# Altium schematic symbol library jlcpcb_2025_04_capacitors_extended_1206.schlib: 2503 symbols (part 4 of 14) (continued)
## 12065D475KAT2A
designator C?  Capacitance: 4.7uF  (hidden comment: *)
Capacitor, Ceramic (MLCC), 4.7uF, ±10%, 50V, X5R, ±10%, SMD 1206; Manufacturer: Kyocera AVX; Manufacturer Part Number: 12065D475KAT2A; Package Size: 1206; JLCPCB Basic Part: No; JLCPCB Part Number: C2175800; Supplier 1: LCSC; Category: Capacitors - MLCC; Supplier Part Number 1: C2175800; Tolerance: ±10%; Voltage Rating: 50V; Temperature Coefficient: X5R; RoHS: Yes; ComponentLink1Description: Datasheet; ComponentLink1URL: https://wmsc.lcsc.com/wmsc/upload/file/pdf/v2/lcsc/2304140030_Kyocera-AVX-12065D475KAT2A_C2175800.pdf; ComponentLink2Description: JLCPCB Part URL; ComponentLink2URL: https://jlcpcb.com/partdetail/C2175800; ComponentLink3Description: LCSC Part URL; ComponentLink3URL: https://lcsc.com/product-detail/Multilayer-Ceramic-Capacitors-MLCC---SMD-SMT_Kyocera-AVX-Kyocera-AVX-12065D475KAT2A_C2175800.html
footprint CAP-1206 (1206 (3216M) Capacitor)
pins: 1, 2

## 12065F104K4T2A
designator C?  Capacitance: 100nF  (hidden comment: *)
Capacitor, Ceramic (MLCC), 100nF, ±10%, 50V, X8R, ±10%, SMD 1206; Manufacturer: Kyocera AVX; Manufacturer Part Number: 12065F104K4T2A; Package Size: 1206; JLCPCB Basic Part: No; JLCPCB Part Number: C2171580; Supplier 1: LCSC; Category: Capacitors - MLCC; Supplier Part Number 1: C2171580; Tolerance: ±10%; Voltage Rating: 50V; Temperature Coefficient: X8R; RoHS: Yes; ComponentLink1Description: Datasheet; ComponentLink1URL: https://wmsc.lcsc.com/wmsc/upload/file/pdf/v2/lcsc/2304140030_Kyocera-AVX-12065F104K4T2A_C2171580.pdf; ComponentLink2Description: JLCPCB Part URL; ComponentLink2URL: https://jlcpcb.com/partdetail/C2171580; ComponentLink3Description: LCSC Part URL; ComponentLink3URL: https://lcsc.com/product-detail/Multilayer-Ceramic-Capacitors-MLCC---SMD-SMT_Kyocera-AVX-Kyocera-AVX-12065F104K4T2A_C2171580.html
footprint CAP-1206 (1206 (3216M) Capacitor)
pins: 1, 2

## 12066C226KAT2A
designator C?  Capacitance: 22uF  (hidden comment: *)
Capacitor, Ceramic (MLCC), 22uF, ±10%, 6.3V, X7R, ±10%, SMD 1206; Manufacturer: AVX; Manufacturer Part Number: 12066C226KAT2A; Package Size: 1206; JLCPCB Basic Part: No; JLCPCB Part Number: C597529; Supplier 1: LCSC; Category: Capacitors - MLCC; Supplier Part Number 1: C597529; Tolerance: ±10%; Voltage Rating: 6.3V; Temperature Coefficient: X7R; RoHS: Yes; ComponentLink1Description: Datasheet; ComponentLink1URL: https://wmsc.lcsc.com/wmsc/upload/file/pdf/v2/lcsc/2304140030_Kyocera-AVX-12066C226KAT2A_C597529.pdf; ComponentLink2Description: JLCPCB Part URL; ComponentLink2URL: https://jlcpcb.com/partdetail/C597529; ComponentLink3Description: LCSC Part URL; ComponentLink3URL: https://lcsc.com/product-detail/Multilayer-Ceramic-Capacitors-MLCC---SMD-SMT_Kyocera-AVX-Kyocera-AVX-12066C226KAT2A_C597529.html
footprint CAP-1206 (1206 (3216M) Capacitor)
pins: 1, 2

## 12066D107MAT2A
designator C?  Capacitance: 100uF  (hidden comment: *)
Capacitor, Ceramic (MLCC), 100uF, ±20%, 6.3V, X5R, ±20%, SMD 1206; Manufacturer: Kyocera AVX; Manufacturer Part Number: 12066D107MAT2A; Package Size: 1206; JLCPCB Basic Part: No; JLCPCB Part Number: C2181396; Supplier 1: LCSC; Category: Capacitors - MLCC; Supplier Part Number 1: C2181396; Tolerance: ±20%; Voltage Rating: 6.3V; Temperature Coefficient: X5R; RoHS: Yes; ComponentLink1Description: Datasheet; ComponentLink1URL: https://wmsc.lcsc.com/wmsc/upload/file/pdf/v2/lcsc/2304140030_Kyocera-AVX-12066D107MAT2A_C2181396.pdf; ComponentLink2Description: JLCPCB Part URL; ComponentLink2URL: https://jlcpcb.com/partdetail/C2181396; ComponentLink3Description: LCSC Part URL; ComponentLink3URL: https://lcsc.com/product-detail/Multilayer-Ceramic-Capacitors-MLCC---SMD-SMT_Kyocera-AVX-Kyocera-AVX-12066D107MAT2A_C2181396.html
footprint CAP-1206 (1206 (3216M) Capacitor)
pins: 1, 2

## 12067A101JAT2A
designator C?  Capacitance: 100pF  (hidden comment: *)
Capacitor, Ceramic (MLCC), 100pF, ±5%, 500V, C0G, ±5%, SMD 1206; Manufacturer: AVX; Manufacturer Part Number: 12067A101JAT2A; Package Size: 1206; JLCPCB Basic Part: No; JLCPCB Part Number: C597533; Supplier 1: LCSC; Category: Capacitors - MLCC; Supplier Part Number 1: C597533; Tolerance: ±5%; Voltage Rating: 500V; Temperature Coefficient: C0G; RoHS: Yes; ComponentLink1Description: Datasheet; ComponentLink1URL: https://wmsc.lcsc.com/wmsc/upload/file/pdf/v2/lcsc/2304140030_Kyocera-AVX-12067A101JAT2A_C597533.pdf; ComponentLink2Description: JLCPCB Part URL; ComponentLink2URL: https://jlcpcb.com/partdetail/C597533; ComponentLink3Description: LCSC Part URL; ComponentLink3URL: https://lcsc.com/product-detail/Multilayer-Ceramic-Capacitors-MLCC---SMD-SMT_Kyocera-AVX-Kyocera-AVX-12067A101JAT2A_C597533.html
footprint CAP-1206 (1206 (3216M) Capacitor)
pins: 1, 2

## AC1206JKNPOZBN102
designator C?  Capacitance: 1nF  (hidden comment: *)
Capacitor, Ceramic (MLCC), 1nF, ±5%, 630V, NP0, ±5%, SMD 1206; Manufacturer: YAGEO; Manufacturer Part Number: AC1206JKNPOZBN102; Package Size: 1206; JLCPCB Basic Part: No; JLCPCB Part Number: C149600; Supplier 1: LCSC; Category: Capacitors - MLCC; Supplier Part Number 1: C149600; Tolerance: ±5%; Voltage Rating: 630V; Temperature Coefficient: NP0; RoHS: Yes; ComponentLink1Description: Datasheet; ComponentLink1URL: https://wmsc.lcsc.com/wmsc/upload/file/pdf/v2/lcsc/2304140030_YAGEO-AC1206JKNPOZBN102_C149600.pdf; ComponentLink2Description: JLCPCB Part URL; ComponentLink2URL: https://jlcpcb.com/partdetail/C149600; ComponentLink3Description: LCSC Part URL; ComponentLink3URL: https://lcsc.com/product-detail/Multilayer-Ceramic-Capacitors-MLCC---SMD-SMT_YAGEO-YAGEO-AC1206JKNPOZBN102_C149600.html
footprint CAP-1206 (1206 (3216M) Capacitor)
pins: 1, 2

## AC1206JRNPO0BN221
designator C?  Capacitance: 220pF  (hidden comment: *)
Capacitor, Ceramic (MLCC), 220pF, ±5%, 100V, NP0, ±5%, SMD 1206; Manufacturer: YAGEO; Manufacturer Part Number: AC1206JRNPO0BN221; Package Size: 1206; JLCPCB Basic Part: No; JLCPCB Part Number: C2173256; Supplier 1: LCSC; Category: Capacitors - MLCC; Supplier Part Number 1: C2173256; Tolerance: ±5%; Voltage Rating: 100V; Temperature Coefficient: NP0; RoHS: Yes; ComponentLink1Description: Datasheet; ComponentLink1URL: https://wmsc.lcsc.com/wmsc/upload/file/pdf/v2/lcsc/2202040630_YAGEO-AC1206JRNPO0BN221_C2173256.pdf; ComponentLink2Description: JLCPCB Part URL; ComponentLink2URL: https://jlcpcb.com/partdetail/C2173256; ComponentLink3Description: LCSC Part URL; ComponentLink3URL: https://lcsc.com/product-detail/Multilayer-Ceramic-Capacitors-MLCC---SMD-SMT_YAGEO-YAGEO-AC1206JRNPO0BN221_C2173256.html
footprint CAP-1206 (1206 (3216M) Capacitor)
pins: 1, 2

## AC1206JRNPO0BN222
designator C?  Capacitance: 2.2nF  (hidden comment: *)
Capacitor, Ceramic (MLCC), 2.2nF, ±5%, 100V, NP0, ±5%, SMD 1206; Manufacturer: YAGEO; Manufacturer Part Number: AC1206JRNPO0BN222; Package Size: 1206; JLCPCB Basic Part: No; JLCPCB Part Number: C2172509; Supplier 1: LCSC; Category: Capacitors - MLCC; Supplier Part Number 1: C2172509; Tolerance: ±5%; Voltage Rating: 100V; Temperature Coefficient: NP0; RoHS: Yes; ComponentLink1Description: Datasheet; ComponentLink1URL: https://wmsc.lcsc.com/wmsc/upload/file/pdf/v2/lcsc/2202040600_YAGEO-AC1206JRNPO0BN222_C2172509.pdf; ComponentLink2Description: JLCPCB Part URL; ComponentLink2URL: https://jlcpcb.com/partdetail/C2172509; ComponentLink3Description: LCSC Part URL; ComponentLink3URL: https://lcsc.com/product-detail/Multilayer-Ceramic-Capacitors-MLCC---SMD-SMT_YAGEO-YAGEO-AC1206JRNPO0BN222_C2172509.html
footprint CAP-1206 (1206 (3216M) Capacitor)
pins: 1, 2

## AC1206JRNPO9BN100
designator C?  Capacitance: 10pF  (hidden comment: *)
Capacitor, Ceramic (MLCC), 10pF, ±5%, 50V, NP0, ±5%, SMD 1206; Manufacturer: YAGEO; Manufacturer Part Number: AC1206JRNPO9BN100; Package Size: 1206; JLCPCB Basic Part: No; JLCPCB Part Number: C2173386; Supplier 1: LCSC; Category: Capacitors - MLCC; Supplier Part Number 1: C2173386; Tolerance: ±5%; Voltage Rating: 50V; Temperature Coefficient: NP0; RoHS: Yes; ComponentLink1Description: Datasheet; ComponentLink1URL: https://wmsc.lcsc.com/wmsc/upload/file/pdf/v2/lcsc/2202040630_YAGEO-AC1206JRNPO9BN100_C2173386.pdf; ComponentLink2Description: JLCPCB Part URL; ComponentLink2URL: https://jlcpcb.com/partdetail/C2173386; ComponentLink3Description: LCSC Part URL; ComponentLink3URL: https://lcsc.com/product-detail/Multilayer-Ceramic-Capacitors-MLCC---SMD-SMT_YAGEO-YAGEO-AC1206JRNPO9BN100_C2173386.html
footprint CAP-1206 (1206 (3216M) Capacitor)
pins: 1, 2

## AC1206JRNPO9BN101
designator C?  Capacitance: 100pF  (hidden comment: *)
Capacitor, Ceramic (MLCC), 100pF, ±5%, 50V, NP0, ±5%, SMD 1206; Manufacturer: YAGEO; Manufacturer Part Number: AC1206JRNPO9BN101; Package Size: 1206; JLCPCB Basic Part: No; JLCPCB Part Number: C2172561; Supplier 1: LCSC; Category: Capacitors - MLCC; Supplier Part Number 1: C2172561; Tolerance: ±5%; Voltage Rating: 50V; Temperature Coefficient: NP0; RoHS: Yes; ComponentLink1Description: Datasheet; ComponentLink1URL: https://wmsc.lcsc.com/wmsc/upload/file/pdf/v2/lcsc/2202040600_YAGEO-AC1206JRNPO9BN101_C2172561.pdf; ComponentLink2Description: JLCPCB Part URL; ComponentLink2URL: https://jlcpcb.com/partdetail/C2172561; ComponentLink3Description: LCSC Part URL; ComponentLink3URL: https://lcsc.com/product-detail/Multilayer-Ceramic-Capacitors-MLCC---SMD-SMT_YAGEO-YAGEO-AC1206JRNPO9BN101_C2172561.html
footprint CAP-1206 (1206 (3216M) Capacitor)
pins: 1, 2

## AC1206JRNPO9BN182
designator C?  Capacitance: 1.8nF  (hidden comment: *)
Capacitor, Ceramic (MLCC), 1.8nF, ±5%, 50V, NP0, ±5%, SMD 1206; Manufacturer: YAGEO; Manufacturer Part Number: AC1206JRNPO9BN182; Package Size: 1206; JLCPCB Basic Part: No; JLCPCB Part Number: C2242686; Supplier 1: LCSC; Category: Capacitors - MLCC; Supplier Part Number 1: C2242686; Tolerance: ±5%; Voltage Rating: 50V; Temperature Coefficient: NP0; RoHS: Yes; ComponentLink1Description: Datasheet; ComponentLink1URL: https://wmsc.lcsc.com/wmsc/upload/file/pdf/v2/lcsc/2304140030_YAGEO-AC1206JRNPO9BN182_C2242686.pdf; ComponentLink2Description: JLCPCB Part URL; ComponentLink2URL: https://jlcpcb.com/partdetail/C2242686; ComponentLink3Description: LCSC Part URL; ComponentLink3URL: https://lcsc.com/product-detail/Multilayer-Ceramic-Capacitors-MLCC---SMD-SMT_YAGEO-YAGEO-AC1206JRNPO9BN182_C2242686.html
footprint CAP-1206 (1206 (3216M) Capacitor)
pins: 1, 2

## AC1206JRNPO9BN222
designator C?  Capacitance: 2.2nF  (hidden comment: *)
Capacitor, Ceramic (MLCC), 2.2nF, ±5%, 50V, NP0, ±5%, SMD 1206; Manufacturer: YAGEO; Manufacturer Part Number: AC1206JRNPO9BN222; Package Size: 1206; JLCPCB Basic Part: No; JLCPCB Part Number: C2175580; Supplier 1: LCSC; Category: Capacitors - MLCC; Supplier Part Number 1: C2175580; Tolerance: ±5%; Voltage Rating: 50V; Temperature Coefficient: NP0; RoHS: Yes; ComponentLink1Description: Datasheet; ComponentLink1URL: https://wmsc.lcsc.com/wmsc/upload/file/pdf/v2/lcsc/2202040800_YAGEO-AC1206JRNPO9BN222_C2175580.pdf; ComponentLink2Description: JLCPCB Part URL; ComponentLink2URL: https://jlcpcb.com/partdetail/C2175580; ComponentLink3Description: LCSC Part URL; ComponentLink3URL: https://lcsc.com/product-detail/Multilayer-Ceramic-Capacitors-MLCC---SMD-SMT_YAGEO-YAGEO-AC1206JRNPO9BN222_C2175580.html
footprint CAP-1206 (1206 (3216M) Capacitor)
pins: 1, 2

## AC1206JRNPO9BN331
designator C?  Capacitance: 330pF  (hidden comment: *)
Capacitor, Ceramic (MLCC), 330pF, ±5%, 50V, NP0, ±5%, SMD 1206; Manufacturer: YAGEO; Manufacturer Part Number: AC1206JRNPO9BN331; Package Size: 1206; JLCPCB Basic Part: No; JLCPCB Part Number: C2228484; Supplier 1: LCSC; Category: Capacitors - MLCC; Supplier Part Number 1: C2228484; Tolerance: ±5%; Voltage Rating: 50V; Temperature Coefficient: NP0; RoHS: Yes; ComponentLink1Description: Datasheet; ComponentLink1URL: https://wmsc.lcsc.com/wmsc/upload/file/pdf/v2/lcsc/2304140030_YAGEO-AC1206JRNPO9BN331_C2228484.pdf; ComponentLink2Description: JLCPCB Part URL; ComponentLink2URL: https://jlcpcb.com/partdetail/C2228484; ComponentLink3Description: LCSC Part URL; ComponentLink3URL: https://lcsc.com/product-detail/Multilayer-Ceramic-Capacitors-MLCC---SMD-SMT_YAGEO-YAGEO-AC1206JRNPO9BN331_C2228484.html
footprint CAP-1206 (1206 (3216M) Capacitor)
pins: 1, 2

## AC1206JRNPO9BN471
designator C?  Capacitance: 470pF  (hidden comment: *)
Capacitor, Ceramic (MLCC), 470pF, ±5%, 50V, NP0, ±5%, SMD 1206; Manufacturer: YAGEO; Manufacturer Part Number: AC1206JRNPO9BN471; Package Size: 1206; JLCPCB Basic Part: No; JLCPCB Part Number: C2173766; Supplier 1: LCSC; Category: Capacitors - MLCC; Supplier Part Number 1: C2173766; Tolerance: ±5%; Voltage Rating: 50V; Temperature Coefficient: NP0; RoHS: Yes; ComponentLink1Description: Datasheet; ComponentLink1URL: https://wmsc.lcsc.com/wmsc/upload/file/pdf/v2/lcsc/2202040630_YAGEO-AC1206JRNPO9BN471_C2173766.pdf; ComponentLink2Description: JLCPCB Part URL; ComponentLink2URL: https://jlcpcb.com/partdetail/C2173766; ComponentLink3Description: LCSC Part URL; ComponentLink3URL: https://lcsc.com/product-detail/Multilayer-Ceramic-Capacitors-MLCC---SMD-SMT_YAGEO-YAGEO-AC1206JRNPO9BN471_C2173766.html
footprint CAP-1206 (1206 (3216M) Capacitor)
pins: 1, 2

## AC1206JRNPOBBN220
designator C?  Capacitance: 22pF  (hidden comment: *)
Capacitor, Ceramic (MLCC), 22pF, ±5%, 500V, NP0, ±5%, SMD 1206; Manufacturer: YAGEO; Manufacturer Part Number: AC1206JRNPOBBN220; Package Size: 1206; JLCPCB Basic Part: No; JLCPCB Part Number: C2179619; Supplier 1: LCSC; Category: Capacitors - MLCC; Supplier Part Number 1: C2179619; Tolerance: ±5%; Voltage Rating: 500V; Temperature Coefficient: NP0; RoHS: Yes; ComponentLink1Description: Datasheet; ComponentLink1URL: https://wmsc.lcsc.com/wmsc/upload/file/pdf/v2/lcsc/2202041100_YAGEO-AC1206JRNPOBBN220_C2179619.pdf; ComponentLink2Description: JLCPCB Part URL; ComponentLink2URL: https://jlcpcb.com/partdetail/C2179619; ComponentLink3Description: LCSC Part URL; ComponentLink3URL: https://lcsc.com/product-detail/Multilayer-Ceramic-Capacitors-MLCC---SMD-SMT_YAGEO-YAGEO-AC1206JRNPOBBN220_C2179619.html
footprint CAP-1206 (1206 (3216M) Capacitor)
pins: 1, 2

## AC1206JRNPOBBN681
designator C?  Capacitance: 680pF  (hidden comment: *)
Capacitor, Ceramic (MLCC), 680pF, ±5%, 500V, C0G, ±5%, SMD 1206; Manufacturer: YAGEO; Manufacturer Part Number: AC1206JRNPOBBN681; Package Size: 1206; JLCPCB Basic Part: No; JLCPCB Part Number: C3871624; Supplier 1: LCSC; Category: Capacitors - MLCC; Supplier Part Number 1: C3871624; Tolerance: ±5%; Voltage Rating: 500V; Temperature Coefficient: C0G; RoHS: Yes; ComponentLink1Description: Datasheet; ComponentLink1URL: https://wmsc.lcsc.com/wmsc/upload/file/pdf/v2/lcsc/2311211113_YAGEO-AC1206JRNPOBBN681_C3871624.pdf; ComponentLink2Description: JLCPCB Part URL; ComponentLink2URL: https://jlcpcb.com/partdetail/C3871624; ComponentLink3Description: LCSC Part URL; ComponentLink3URL: https://lcsc.com/product-detail/Multilayer-Ceramic-Capacitors-MLCC---SMD-SMT_YAGEO-YAGEO-AC1206JRNPOBBN681_C3871624.html
footprint CAP-1206 (1206 (3216M) Capacitor)
pins: 1, 2

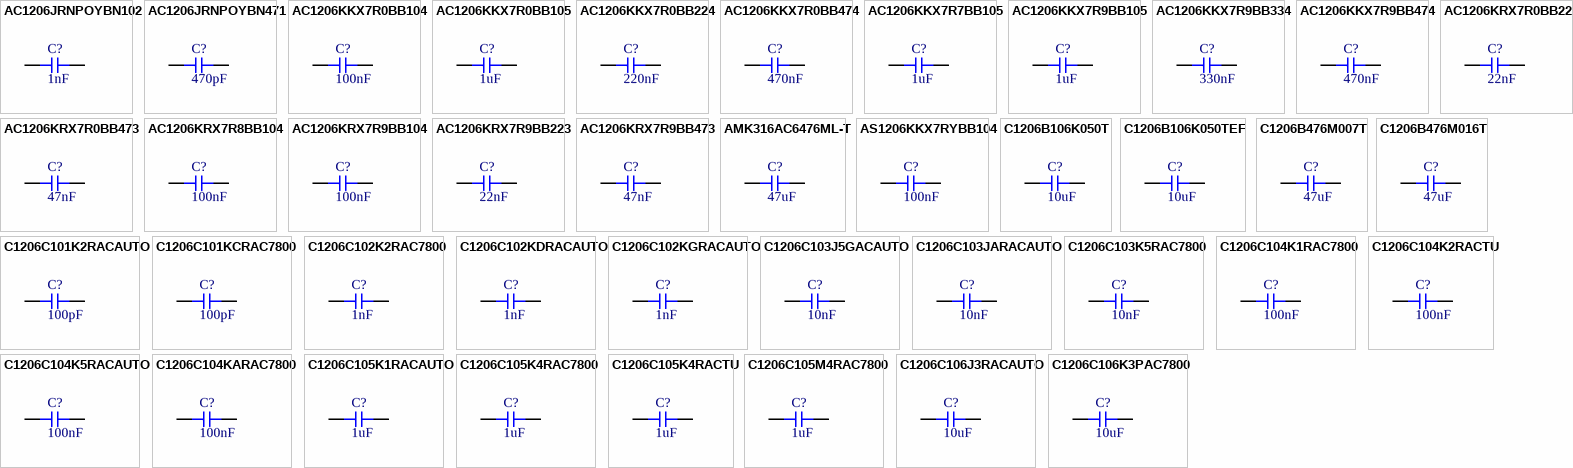
[diagram p15: symbols AC1206JRNPOYBN102 to C1206C106K3PAC7800]

## AC1206JRNPOYBN102
designator C?  Capacitance: 1nF  (hidden comment: *)
Capacitor, Ceramic (MLCC), 1nF, ±5%, 250V, C0G, ±5%, SMD 1206; Manufacturer: YAGEO; Manufacturer Part Number: AC1206JRNPOYBN102; Package Size: 1206; JLCPCB Basic Part: No; JLCPCB Part Number: C3871879; Supplier 1: LCSC; Category: Capacitors - MLCC; Supplier Part Number 1: C3871879; Tolerance: ±5%; Voltage Rating: 250V; Temperature Coefficient: C0G; RoHS: Yes; ComponentLink1Description: Datasheet; ComponentLink1URL: https://wmsc.lcsc.com/wmsc/upload/file/pdf/v2/lcsc/2311211113_YAGEO-AC1206JRNPOYBN102_C3871879.pdf; ComponentLink2Description: JLCPCB Part URL; ComponentLink2URL: https://jlcpcb.com/partdetail/C3871879; ComponentLink3Description: LCSC Part URL; ComponentLink3URL: https://lcsc.com/product-detail/Multilayer-Ceramic-Capacitors-MLCC---SMD-SMT_YAGEO-YAGEO-AC1206JRNPOYBN102_C3871879.html
footprint CAP-1206 (1206 (3216M) Capacitor)
pins: 1, 2

## AC1206JRNPOYBN471
designator C?  Capacitance: 470pF  (hidden comment: *)
Capacitor, Ceramic (MLCC), 470pF, ±5%, 250V, NP0, ±5%, SMD 1206; Manufacturer: YAGEO; Manufacturer Part Number: AC1206JRNPOYBN471; Package Size: 1206; JLCPCB Basic Part: No; JLCPCB Part Number: C2172346; Supplier 1: LCSC; Category: Capacitors - MLCC; Supplier Part Number 1: C2172346; Tolerance: ±5%; Voltage Rating: 250V; Temperature Coefficient: NP0; RoHS: Yes; ComponentLink1Description: Datasheet; ComponentLink1URL: https://wmsc.lcsc.com/wmsc/upload/file/pdf/v2/lcsc/2202040600_YAGEO-AC1206JRNPOYBN471_C2172346.pdf; ComponentLink2Description: JLCPCB Part URL; ComponentLink2URL: https://jlcpcb.com/partdetail/C2172346; ComponentLink3Description: LCSC Part URL; ComponentLink3URL: https://lcsc.com/product-detail/Multilayer-Ceramic-Capacitors-MLCC---SMD-SMT_YAGEO-YAGEO-AC1206JRNPOYBN471_C2172346.html
footprint CAP-1206 (1206 (3216M) Capacitor)
pins: 1, 2

## AC1206KKX7R0BB104
designator C?  Capacitance: 100nF  (hidden comment: *)
Capacitor, Ceramic (MLCC), 100nF, ±10%, 100V, X7R, ±10%, SMD 1206; Manufacturer: YAGEO; Manufacturer Part Number: AC1206KKX7R0BB104; Package Size: 1206; JLCPCB Basic Part: No; JLCPCB Part Number: C149601; Supplier 1: LCSC; Category: Capacitors - MLCC; Supplier Part Number 1: C149601; Tolerance: ±10%; Voltage Rating: 100V; Temperature Coefficient: X7R; RoHS: Yes; ComponentLink1Description: Datasheet; ComponentLink1URL: https://wmsc.lcsc.com/wmsc/upload/file/pdf/v2/lcsc/2304140030_YAGEO-AC1206KKX7R0BB104_C149601.pdf; ComponentLink2Description: JLCPCB Part URL; ComponentLink2URL: https://jlcpcb.com/partdetail/C149601; ComponentLink3Description: LCSC Part URL; ComponentLink3URL: https://lcsc.com/product-detail/Multilayer-Ceramic-Capacitors-MLCC---SMD-SMT_YAGEO-YAGEO-AC1206KKX7R0BB104_C149601.html
footprint CAP-1206 (1206 (3216M) Capacitor)
pins: 1, 2

## AC1206KKX7R0BB105
designator C?  Capacitance: 1uF  (hidden comment: *)
Capacitor, Ceramic (MLCC), 1uF, ±10%, 100V, X7R, ±10%, SMD 1206; Manufacturer: YAGEO; Manufacturer Part Number: AC1206KKX7R0BB105; Package Size: 1206; JLCPCB Basic Part: No; JLCPCB Part Number: C2936627; Supplier 1: LCSC; Category: Capacitors - MLCC; Supplier Part Number 1: C2936627; Tolerance: ±10%; Voltage Rating: 100V; Temperature Coefficient: X7R; RoHS: Yes; ComponentLink1Description: Datasheet; ComponentLink1URL: https://wmsc.lcsc.com/wmsc/upload/file/pdf/v2/lcsc/2201121730_YAGEO-AC1206KKX7R0BB105_C2936627.pdf; ComponentLink2Description: JLCPCB Part URL; ComponentLink2URL: https://jlcpcb.com/partdetail/C2936627; ComponentLink3Description: LCSC Part URL; ComponentLink3URL: https://lcsc.com/product-detail/Multilayer-Ceramic-Capacitors-MLCC---SMD-SMT_YAGEO-YAGEO-AC1206KKX7R0BB105_C2936627.html
footprint CAP-1206 (1206 (3216M) Capacitor)
pins: 1, 2

## AC1206KKX7R0BB224
designator C?  Capacitance: 220nF  (hidden comment: *)
Capacitor, Ceramic (MLCC), 220nF, ±10%, 100V, X7R, ±10%, SMD 1206; Manufacturer: YAGEO; Manufacturer Part Number: AC1206KKX7R0BB224; Package Size: 1206; JLCPCB Basic Part: No; JLCPCB Part Number: C389112; Supplier 1: LCSC; Category: Capacitors - MLCC; Supplier Part Number 1: C389112; Tolerance: ±10%; Voltage Rating: 100V; Temperature Coefficient: X7R; RoHS: Yes; ComponentLink1Description: Datasheet; ComponentLink1URL: https://wmsc.lcsc.com/wmsc/upload/file/pdf/v2/lcsc/1912111437_YAGEO-AC1206KKX7R0BB224_C389112.pdf; ComponentLink2Description: JLCPCB Part URL; ComponentLink2URL: https://jlcpcb.com/partdetail/C389112; ComponentLink3Description: LCSC Part URL; ComponentLink3URL: https://lcsc.com/product-detail/Multilayer-Ceramic-Capacitors-MLCC---SMD-SMT_YAGEO-YAGEO-AC1206KKX7R0BB224_C389112.html
footprint CAP-1206 (1206 (3216M) Capacitor)
pins: 1, 2

## AC1206KKX7R0BB474
designator C?  Capacitance: 470nF  (hidden comment: *)
Capacitor, Ceramic (MLCC), 470nF, ±10%, 100V, X7R, ±10%, SMD 1206; Manufacturer: YAGEO; Manufacturer Part Number: AC1206KKX7R0BB474; Package Size: 1206; JLCPCB Basic Part: No; JLCPCB Part Number: C726603; Supplier 1: LCSC; Category: Capacitors - MLCC; Supplier Part Number 1: C726603; Tolerance: ±10%; Voltage Rating: 100V; Temperature Coefficient: X7R; RoHS: Yes; ComponentLink1Description: Datasheet; ComponentLink1URL: https://wmsc.lcsc.com/wmsc/upload/file/pdf/v2/lcsc/2304140030_YAGEO-AC1206KKX7R0BB474_C726603.pdf; ComponentLink2Description: JLCPCB Part URL; ComponentLink2URL: https://jlcpcb.com/partdetail/C726603; ComponentLink3Description: LCSC Part URL; ComponentLink3URL: https://lcsc.com/product-detail/Multilayer-Ceramic-Capacitors-MLCC---SMD-SMT_YAGEO-YAGEO-AC1206KKX7R0BB474_C726603.html
footprint CAP-1206 (1206 (3216M) Capacitor)
pins: 1, 2

## AC1206KKX7R7BB105
designator C?  Capacitance: 1uF  (hidden comment: *)
Capacitor, Ceramic (MLCC), 1uF, ±10%, 16V, X7R, ±10%, SMD 1206; Manufacturer: YAGEO; Manufacturer Part Number: AC1206KKX7R7BB105; Package Size: 1206; JLCPCB Basic Part: No; JLCPCB Part Number: C2172210; Supplier 1: LCSC; Category: Capacitors - MLCC; Supplier Part Number 1: C2172210; Tolerance: ±10%; Voltage Rating: 16V; Temperature Coefficient: X7R; RoHS: Yes; ComponentLink1Description: Datasheet; ComponentLink1URL: https://wmsc.lcsc.com/wmsc/upload/file/pdf/v2/lcsc/2202040530_YAGEO-AC1206KKX7R7BB105_C2172210.pdf; ComponentLink2Description: JLCPCB Part URL; ComponentLink2URL: https://jlcpcb.com/partdetail/C2172210; ComponentLink3Description: LCSC Part URL; ComponentLink3URL: https://lcsc.com/product-detail/Multilayer-Ceramic-Capacitors-MLCC---SMD-SMT_YAGEO-YAGEO-AC1206KKX7R7BB105_C2172210.html
footprint CAP-1206 (1206 (3216M) Capacitor)
pins: 1, 2

## AC1206KKX7R9BB105
designator C?  Capacitance: 1uF  (hidden comment: *)
Capacitor, Ceramic (MLCC), 1uF, ±10%, 50V, X7R, ±10%, SMD 1206; Manufacturer: YAGEO; Manufacturer Part Number: AC1206KKX7R9BB105; Package Size: 1206; JLCPCB Basic Part: No; JLCPCB Part Number: C1853626; Supplier 1: LCSC; Category: Capacitors - MLCC; Supplier Part Number 1: C1853626; Tolerance: ±10%; Voltage Rating: 50V; Temperature Coefficient: X7R; RoHS: Yes; ComponentLink1Description: Datasheet; ComponentLink1URL: https://wmsc.lcsc.com/wmsc/upload/file/pdf/v2/lcsc/2202151130_YAGEO-AC1206KKX7R9BB105_C1853626.pdf; ComponentLink2Description: JLCPCB Part URL; ComponentLink2URL: https://jlcpcb.com/partdetail/C1853626; ComponentLink3Description: LCSC Part URL; ComponentLink3URL: https://lcsc.com/product-detail/Multilayer-Ceramic-Capacitors-MLCC---SMD-SMT_YAGEO-YAGEO-AC1206KKX7R9BB105_C1853626.html
footprint CAP-1206 (1206 (3216M) Capacitor)
pins: 1, 2

## AC1206KKX7R9BB334
designator C?  Capacitance: 330nF  (hidden comment: *)
Capacitor, Ceramic (MLCC), 330nF, ±10%, 50V, X7R, ±10%, SMD 1206; Manufacturer: YAGEO; Manufacturer Part Number: AC1206KKX7R9BB334; Package Size: 1206; JLCPCB Basic Part: No; JLCPCB Part Number: C2257815; Supplier 1: LCSC; Category: Capacitors - MLCC; Supplier Part Number 1: C2257815; Tolerance: ±10%; Voltage Rating: 50V; Temperature Coefficient: X7R; RoHS: Yes; ComponentLink1Description: Datasheet; ComponentLink1URL: https://wmsc.lcsc.com/wmsc/upload/file/pdf/v2/lcsc/2304140030_YAGEO-AC1206KKX7R9BB334_C2257815.pdf; ComponentLink2Description: JLCPCB Part URL; ComponentLink2URL: https://jlcpcb.com/partdetail/C2257815; ComponentLink3Description: LCSC Part URL; ComponentLink3URL: https://lcsc.com/product-detail/Multilayer-Ceramic-Capacitors-MLCC---SMD-SMT_YAGEO-YAGEO-AC1206KKX7R9BB334_C2257815.html
footprint CAP-1206 (1206 (3216M) Capacitor)
pins: 1, 2

## AC1206KKX7R9BB474
designator C?  Capacitance: 470nF  (hidden comment: *)
Capacitor, Ceramic (MLCC), 470nF, ±10%, 50V, X7R, ±10%, SMD 1206; Manufacturer: YAGEO; Manufacturer Part Number: AC1206KKX7R9BB474; Package Size: 1206; JLCPCB Basic Part: No; JLCPCB Part Number: C2173665; Supplier 1: LCSC; Category: Capacitors - MLCC; Supplier Part Number 1: C2173665; Tolerance: ±10%; Voltage Rating: 50V; Temperature Coefficient: X7R; RoHS: Yes; ComponentLink1Description: Datasheet; ComponentLink1URL: https://wmsc.lcsc.com/wmsc/upload/file/pdf/v2/lcsc/2202040630_YAGEO-AC1206KKX7R9BB474_C2173665.pdf; ComponentLink2Description: JLCPCB Part URL; ComponentLink2URL: https://jlcpcb.com/partdetail/C2173665; ComponentLink3Description: LCSC Part URL; ComponentLink3URL: https://lcsc.com/product-detail/Multilayer-Ceramic-Capacitors-MLCC---SMD-SMT_YAGEO-YAGEO-AC1206KKX7R9BB474_C2173665.html
footprint CAP-1206 (1206 (3216M) Capacitor)
pins: 1, 2

## AC1206KRX7R0BB223
designator C?  Capacitance: 22nF  (hidden comment: *)
Capacitor, Ceramic (MLCC), 22nF, ±10%, 100V, X7R, ±10%, SMD 1206; Manufacturer: YAGEO; Manufacturer Part Number: AC1206KRX7R0BB223; Package Size: 1206; JLCPCB Basic Part: No; JLCPCB Part Number: C2172564; Supplier 1: LCSC; Category: Capacitors - MLCC; Supplier Part Number 1: C2172564; Tolerance: ±10%; Voltage Rating: 100V; Temperature Coefficient: X7R; RoHS: Yes; ComponentLink1Description: Datasheet; ComponentLink1URL: https://wmsc.lcsc.com/wmsc/upload/file/pdf/v2/lcsc/2202040600_YAGEO-AC1206KRX7R0BB223_C2172564.pdf; ComponentLink2Description: JLCPCB Part URL; ComponentLink2URL: https://jlcpcb.com/partdetail/C2172564; ComponentLink3Description: LCSC Part URL; ComponentLink3URL: https://lcsc.com/product-detail/Multilayer-Ceramic-Capacitors-MLCC---SMD-SMT_YAGEO-YAGEO-AC1206KRX7R0BB223_C2172564.html
footprint CAP-1206 (1206 (3216M) Capacitor)
pins: 1, 2

## AC1206KRX7R0BB473
designator C?  Capacitance: 47nF  (hidden comment: *)
Capacitor, Ceramic (MLCC), 47nF, ±10%, 100V, X7R, ±10%, SMD 1206; Manufacturer: YAGEO; Manufacturer Part Number: AC1206KRX7R0BB473; Package Size: 1206; JLCPCB Basic Part: No; JLCPCB Part Number: C3852310; Supplier 1: LCSC; Category: Capacitors - MLCC; Supplier Part Number 1: C3852310; Tolerance: ±10%; Voltage Rating: 100V; Temperature Coefficient: X7R; RoHS: Yes; ComponentLink1Description: Datasheet; ComponentLink1URL: https://wmsc.lcsc.com/wmsc/upload/file/pdf/v2/lcsc/2311211113_YAGEO-AC1206KRX7R0BB473_C3852310.pdf; ComponentLink2Description: JLCPCB Part URL; ComponentLink2URL: https://jlcpcb.com/partdetail/C3852310; ComponentLink3Description: LCSC Part URL; ComponentLink3URL: https://lcsc.com/product-detail/Multilayer-Ceramic-Capacitors-MLCC---SMD-SMT_YAGEO-YAGEO-AC1206KRX7R0BB473_C3852310.html
footprint CAP-1206 (1206 (3216M) Capacitor)
pins: 1, 2

## AC1206KRX7R8BB104
designator C?  Capacitance: 100nF  (hidden comment: *)
Capacitor, Ceramic (MLCC), 100nF, ±10%, 25V, X7R, ±10%, SMD 1206; Manufacturer: YAGEO; Manufacturer Part Number: AC1206KRX7R8BB104; Package Size: 1206; JLCPCB Basic Part: No; JLCPCB Part Number: C2172416; Supplier 1: LCSC; Category: Capacitors - MLCC; Supplier Part Number 1: C2172416; Tolerance: ±10%; Voltage Rating: 25V; Temperature Coefficient: X7R; RoHS: Yes; ComponentLink1Description: Datasheet; ComponentLink1URL: https://wmsc.lcsc.com/wmsc/upload/file/pdf/v2/lcsc/2202040600_YAGEO-AC1206KRX7R8BB104_C2172416.pdf; ComponentLink2Description: JLCPCB Part URL; ComponentLink2URL: https://jlcpcb.com/partdetail/C2172416; ComponentLink3Description: LCSC Part URL; ComponentLink3URL: https://lcsc.com/product-detail/Multilayer-Ceramic-Capacitors-MLCC---SMD-SMT_YAGEO-YAGEO-AC1206KRX7R8BB104_C2172416.html
footprint CAP-1206 (1206 (3216M) Capacitor)
pins: 1, 2

## AC1206KRX7R9BB104
designator C?  Capacitance: 100nF  (hidden comment: *)
Capacitor, Ceramic (MLCC), 100nF, ±10%, 50V, X7R, ±10%, SMD 1206; Manufacturer: YAGEO; Manufacturer Part Number: AC1206KRX7R9BB104; Package Size: 1206; JLCPCB Basic Part: No; JLCPCB Part Number: C149603; Supplier 1: LCSC; Category: Capacitors - MLCC; Supplier Part Number 1: C149603; Tolerance: ±10%; Voltage Rating: 50V; Temperature Coefficient: X7R; RoHS: Yes; ComponentLink1Description: Datasheet; ComponentLink1URL: https://wmsc.lcsc.com/wmsc/upload/file/pdf/v2/lcsc/2304140030_YAGEO-AC1206KRX7R9BB104_C149603.pdf; ComponentLink2Description: JLCPCB Part URL; ComponentLink2URL: https://jlcpcb.com/partdetail/C149603; ComponentLink3Description: LCSC Part URL; ComponentLink3URL: https://lcsc.com/product-detail/Multilayer-Ceramic-Capacitors-MLCC---SMD-SMT_YAGEO-YAGEO-AC1206KRX7R9BB104_C149603.html
footprint CAP-1206 (1206 (3216M) Capacitor)
pins: 1, 2

## AC1206KRX7R9BB223
designator C?  Capacitance: 22nF  (hidden comment: *)
Capacitor, Ceramic (MLCC), 22nF, ±10%, 50V, X7R, ±10%, SMD 1206; Manufacturer: YAGEO; Manufacturer Part Number: AC1206KRX7R9BB223; Package Size: 1206; JLCPCB Basic Part: No; JLCPCB Part Number: C726607; Supplier 1: LCSC; Category: Capacitors - MLCC; Supplier Part Number 1: C726607; Tolerance: ±10%; Voltage Rating: 50V; Temperature Coefficient: X7R; RoHS: Yes; ComponentLink1Description: Datasheet; ComponentLink1URL: https://wmsc.lcsc.com/wmsc/upload/file/pdf/v2/lcsc/2304140030_YAGEO-AC1206KRX7R9BB223_C726607.pdf; ComponentLink2Description: JLCPCB Part URL; ComponentLink2URL: https://jlcpcb.com/partdetail/C726607; ComponentLink3Description: LCSC Part URL; ComponentLink3URL: https://lcsc.com/product-detail/Multilayer-Ceramic-Capacitors-MLCC---SMD-SMT_YAGEO-YAGEO-AC1206KRX7R9BB223_C726607.html
footprint CAP-1206 (1206 (3216M) Capacitor)
pins: 1, 2

## AC1206KRX7R9BB473
designator C?  Capacitance: 47nF  (hidden comment: *)
Capacitor, Ceramic (MLCC), 47nF, ±10%, 50V, X7R, ±10%, SMD 1206; Manufacturer: YAGEO; Manufacturer Part Number: AC1206KRX7R9BB473; Package Size: 1206; JLCPCB Basic Part: No; JLCPCB Part Number: C726609; Supplier 1: LCSC; Category: Capacitors - MLCC; Supplier Part Number 1: C726609; Tolerance: ±10%; Voltage Rating: 50V; Temperature Coefficient: X7R; RoHS: Yes; ComponentLink1Description: Datasheet; ComponentLink1URL: https://wmsc.lcsc.com/wmsc/upload/file/pdf/v2/lcsc/2012011712_YAGEO-AC1206KRX7R9BB473_C726609.pdf; ComponentLink2Description: JLCPCB Part URL; ComponentLink2URL: https://jlcpcb.com/partdetail/C726609; ComponentLink3Description: LCSC Part URL; ComponentLink3URL: https://lcsc.com/product-detail/Multilayer-Ceramic-Capacitors-MLCC---SMD-SMT_YAGEO-YAGEO-AC1206KRX7R9BB473_C726609.html
footprint CAP-1206 (1206 (3216M) Capacitor)
pins: 1, 2

## AMK316AC6476ML-T
designator C?  Capacitance: 47uF  (hidden comment: *)
Capacitor, Ceramic (MLCC), 47uF, ±20%, 4V, X6S, ±20%, SMD 1206; Manufacturer: Taiyo Yuden; Manufacturer Part Number: AMK316AC6476ML-T; Package Size: 1206; JLCPCB Basic Part: No; JLCPCB Part Number: C2176013; Supplier 1: LCSC; Category: Capacitors - MLCC; Supplier Part Number 1: C2176013; Tolerance: ±20%; Voltage Rating: 4V; Temperature Coefficient: X6S; RoHS: Yes; ComponentLink1Description: Datasheet; ComponentLink1URL: https://wmsc.lcsc.com/wmsc/upload/file/pdf/v2/lcsc/2309051414_Taiyo-Yuden-AMK316AC6476ML-T_C2176013.pdf; ComponentLink2Description: JLCPCB Part URL; ComponentLink2URL: https://jlcpcb.com/partdetail/C2176013; ComponentLink3Description: LCSC Part URL; ComponentLink3URL: https://lcsc.com/product-detail/Multilayer-Ceramic-Capacitors-MLCC---SMD-SMT_Taiyo-Yuden-Taiyo-Yuden-AMK316AC6476ML-T_C2176013.html
footprint CAP-1206 (1206 (3216M) Capacitor)
pins: 1, 2

## AS1206KKX7RYBB104
designator C?  Capacitance: 100nF  (hidden comment: *)
Capacitor, Ceramic (MLCC), 100nF, ±10%, 250V, X7R, ±10%, SMD 1206; Manufacturer: YAGEO; Manufacturer Part Number: AS1206KKX7RYBB104; Package Size: 1206; JLCPCB Basic Part: No; JLCPCB Part Number: C3881218; Supplier 1: LCSC; Category: Capacitors - MLCC; Supplier Part Number 1: C3881218; Tolerance: ±10%; Voltage Rating: 250V; Temperature Coefficient: X7R; RoHS: Yes; ComponentLink1Description: Datasheet; ComponentLink1URL: https://wmsc.lcsc.com/wmsc/upload/file/pdf/v2/lcsc/2311271023_YAGEO-AS1206KKX7RYBB104_C3881218.pdf; ComponentLink2Description: JLCPCB Part URL; ComponentLink2URL: https://jlcpcb.com/partdetail/C3881218; ComponentLink3Description: LCSC Part URL; ComponentLink3URL: https://lcsc.com/product-detail/Multilayer-Ceramic-Capacitors-MLCC---SMD-SMT_YAGEO-YAGEO-AS1206KKX7RYBB104_C3881218.html
footprint CAP-1206 (1206 (3216M) Capacitor)
pins: 1, 2

## C1206B106K050T
designator C?  Capacitance: 10uF  (hidden comment: *)
Capacitor, Ceramic (MLCC), 10uF, ±10%, 50V, X5R, ±10%, SMD 1206; Manufacturer: IHHEC(HOLY STONE ENTERPRISE CO., LTD); Manufacturer Part Number: C1206B106K050T; Package Size: 1206; JLCPCB Basic Part: No; JLCPCB Part Number: C113502; Supplier 1: LCSC; Category: Capacitors - MLCC; Supplier Part Number 1: C113502; Tolerance: ±10%; Voltage Rating: 50V; Temperature Coefficient: X5R; RoHS: Yes; ComponentLink1Description: Datasheet; ComponentLink1URL: https://wmsc.lcsc.com/wmsc/upload/file/pdf/v2/lcsc/2304140030_IHHEC-HOLY-STONE-ENTERPRISE-CO---LTD-C1206B106K050T_C113502.pdf; ComponentLink2Description: JLCPCB Part URL; ComponentLink2URL: https://jlcpcb.com/partdetail/C113502; ComponentLink3Description: LCSC Part URL; ComponentLink3URL: https://lcsc.com/product-detail/Multilayer-Ceramic-Capacitors-MLCC---SMD-SMT_IHHECHOLY-STONE-ENTERPRISE-CO.%2C-LTD-IHHECHOLY-STONE-ENTERPRISE-CO.%2C-LTD-C1206B106K050T_C113502.html
footprint CAP-1206 (1206 (3216M) Capacitor)
pins: 1, 2

## C1206B106K050TEF
designator C?  Capacitance: 10uF  (hidden comment: *)
Capacitor, Ceramic (MLCC), 10uF, ±10%, 50V, X5R, ±10%, SMD 1206; Manufacturer: IHHEC(HOLY STONE ENTERPRISE CO., LTD); Manufacturer Part Number: C1206B106K050TEF; Package Size: 1206; JLCPCB Basic Part: No; JLCPCB Part Number: C2991915; Supplier 1: LCSC; Category: Capacitors - MLCC; Supplier Part Number 1: C2991915; Tolerance: ±10%; Voltage Rating: 50V; Temperature Coefficient: X5R; RoHS: Yes; ComponentLink1Description: Datasheet; ComponentLink1URL: https://wmsc.lcsc.com/wmsc/upload/file/pdf/v2/lcsc/2204220915_IHHEC-HOLY-STONE-ENTERPRISE-CO---LTD-C1206B106K050TEF_C2991915.pdf; ComponentLink2Description: JLCPCB Part URL; ComponentLink2URL: https://jlcpcb.com/partdetail/C2991915; ComponentLink3Description: LCSC Part URL; ComponentLink3URL: https://lcsc.com/product-detail/Multilayer-Ceramic-Capacitors-MLCC---SMD-SMT_IHHECHOLY-STONE-ENTERPRISE-CO.%2C-LTD-IHHECHOLY-STONE-ENTERPRISE-CO.%2C-LTD-C1206B106K050TEF_C2991915.html
footprint CAP-1206 (1206 (3216M) Capacitor)
pins: 1, 2

## C1206B476M007T
designator C?  Capacitance: 47uF  (hidden comment: *)
Capacitor, Ceramic (MLCC), 47uF, 6.3V, X5R, SMD 1206; Manufacturer: IHHEC(HOLY STONE ENTERPRISE CO., LTD); Manufacturer Part Number: C1206B476M007T; Package Size: 1206; JLCPCB Basic Part: No; JLCPCB Part Number: C2991900; Supplier 1: LCSC; Category: Capacitors - MLCC; Supplier Part Number 1: C2991900; Voltage Rating: 6.3V; Temperature Coefficient: X5R; RoHS: Yes; ComponentLink1Description: Datasheet; ComponentLink1URL: https://wmsc.lcsc.com/wmsc/upload/file/pdf/v2/lcsc/2204082030_IHHEC-HOLY-STONE-ENTERPRISE-CO---LTD-C1206B476M007T_C2991900.pdf; ComponentLink2Description: JLCPCB Part URL; ComponentLink2URL: https://jlcpcb.com/partdetail/C2991900; ComponentLink3Description: LCSC Part URL; ComponentLink3URL: https://lcsc.com/product-detail/Multilayer-Ceramic-Capacitors-MLCC---SMD-SMT_IHHECHOLY-STONE-ENTERPRISE-CO.%2C-LTD-IHHECHOLY-STONE-ENTERPRISE-CO.%2C-LTD-C1206B476M007T_C2991900.html
footprint CAP-1206 (1206 (3216M) Capacitor)
pins: 1, 2

## C1206B476M016T
designator C?  Capacitance: 47uF  (hidden comment: *)
Capacitor, Ceramic (MLCC), 47uF, ±20%, 16V, ±20%, SMD 1206; Manufacturer: IHHEC(HOLY STONE ENTERPRISE CO., LTD); Manufacturer Part Number: C1206B476M016T; Package Size: 1206; JLCPCB Basic Part: No; JLCPCB Part Number: C607993; Supplier 1: LCSC; Category: Capacitors - MLCC; Supplier Part Number 1: C607993; Tolerance: ±20%; Voltage Rating: 16V; RoHS: Yes; ComponentLink1Description: Datasheet; ComponentLink1URL: https://wmsc.lcsc.com/wmsc/upload/file/pdf/v2/lcsc/2304140030_IHHEC-HOLY-STONE-ENTERPRISE-CO---LTD-C1206B476M016T_C607993.pdf; ComponentLink2Description: JLCPCB Part URL; ComponentLink2URL: https://jlcpcb.com/partdetail/C607993; ComponentLink3Description: LCSC Part URL; ComponentLink3URL: https://lcsc.com/product-detail/Multilayer-Ceramic-Capacitors-MLCC---SMD-SMT_IHHECHOLY-STONE-ENTERPRISE-CO.%2C-LTD-IHHECHOLY-STONE-ENTERPRISE-CO.%2C-LTD-C1206B476M016T_C607993.html
footprint CAP-1206 (1206 (3216M) Capacitor)
pins: 1, 2

## C1206C101K2RACAUTO
designator C?  Capacitance: 100pF  (hidden comment: *)
Capacitor, Ceramic (MLCC), 100pF, ±10%, 200V, X7R, ±10%, SMD 1206; Manufacturer: KEMET; Manufacturer Part Number: C1206C101K2RACAUTO; Package Size: 1206; JLCPCB Basic Part: No; JLCPCB Part Number: C129666; Supplier 1: LCSC; Category: Capacitors - MLCC; Supplier Part Number 1: C129666; Tolerance: ±10%; Voltage Rating: 200V; Temperature Coefficient: X7R; RoHS: Yes; ComponentLink1Description: Datasheet; ComponentLink1URL: https://wmsc.lcsc.com/wmsc/upload/file/pdf/v2/lcsc/2304140030_KEMET-C1206C101K2RACAUTO_C129666.pdf; ComponentLink2Description: JLCPCB Part URL; ComponentLink2URL: https://jlcpcb.com/partdetail/C129666; ComponentLink3Description: LCSC Part URL; ComponentLink3URL: https://lcsc.com/product-detail/Multilayer-Ceramic-Capacitors-MLCC---SMD-SMT_KEMET-KEMET-C1206C101K2RACAUTO_C129666.html
footprint CAP-1206 (1206 (3216M) Capacitor)
pins: 1, 2

## C1206C101KCRAC7800
designator C?  Capacitance: 100pF  (hidden comment: *)
Capacitor, Ceramic (MLCC), 100pF, ±10%, 500V, X7R, ±10%, SMD 1206; Manufacturer: KEMET; Manufacturer Part Number: C1206C101KCRAC7800; Package Size: 1206; JLCPCB Basic Part: No; JLCPCB Part Number: C141176; Supplier 1: LCSC; Category: Capacitors - MLCC; Supplier Part Number 1: C141176; Tolerance: ±10%; Voltage Rating: 500V; Temperature Coefficient: X7R; RoHS: Yes; ComponentLink1Description: Datasheet; ComponentLink1URL: https://wmsc.lcsc.com/wmsc/upload/file/pdf/v2/lcsc/2304140030_KEMET-C1206C101KCRAC7800_C141176.pdf; ComponentLink2Description: JLCPCB Part URL; ComponentLink2URL: https://jlcpcb.com/partdetail/C141176; ComponentLink3Description: LCSC Part URL; ComponentLink3URL: https://lcsc.com/product-detail/Multilayer-Ceramic-Capacitors-MLCC---SMD-SMT_KEMET-KEMET-C1206C101KCRAC7800_C141176.html
footprint CAP-1206 (1206 (3216M) Capacitor)
pins: 1, 2

## C1206C102K2RAC7800
designator C?  Capacitance: 1nF  (hidden comment: *)
Capacitor, Ceramic (MLCC), 1nF, ±10%, 200V, X7R, ±10%, SMD 1206; Manufacturer: KEMET; Manufacturer Part Number: C1206C102K2RAC7800; Package Size: 1206; JLCPCB Basic Part: No; JLCPCB Part Number: C141177; Supplier 1: LCSC; Category: Capacitors - MLCC; Supplier Part Number 1: C141177; Tolerance: ±10%; Voltage Rating: 200V; Temperature Coefficient: X7R; RoHS: Yes; ComponentLink1Description: Datasheet; ComponentLink1URL: https://wmsc.lcsc.com/wmsc/upload/file/pdf/v2/lcsc/2304140030_KEMET-C1206C102K2RAC7800_C141177.pdf; ComponentLink2Description: JLCPCB Part URL; ComponentLink2URL: https://jlcpcb.com/partdetail/C141177; ComponentLink3Description: LCSC Part URL; ComponentLink3URL: https://lcsc.com/product-detail/Multilayer-Ceramic-Capacitors-MLCC---SMD-SMT_KEMET-KEMET-C1206C102K2RAC7800_C141177.html
footprint CAP-1206 (1206 (3216M) Capacitor)
pins: 1, 2

## C1206C102KDRACAUTO
designator C?  Capacitance: 1nF  (hidden comment: *)
Capacitor, Ceramic (MLCC), 1nF, ±10%, 1kV, X7R, ±10%, SMD 1206; Manufacturer: KEMET; Manufacturer Part Number: C1206C102KDRACAUTO; Package Size: 1206; JLCPCB Basic Part: No; JLCPCB Part Number: C2182159; Supplier 1: LCSC; Category: Capacitors - MLCC; Supplier Part Number 1: C2182159; Tolerance: ±10%; Voltage Rating: 1kV; Temperature Coefficient: X7R; RoHS: Yes; ComponentLink1Description: Datasheet; ComponentLink1URL: https://wmsc.lcsc.com/wmsc/upload/file/pdf/v2/lcsc/2304140030_KEMET-C1206C102KDRACAUTO_C2182159.pdf; ComponentLink2Description: JLCPCB Part URL; ComponentLink2URL: https://jlcpcb.com/partdetail/C2182159; ComponentLink3Description: LCSC Part URL; ComponentLink3URL: https://lcsc.com/product-detail/Multilayer-Ceramic-Capacitors-MLCC---SMD-SMT_KEMET-KEMET-C1206C102KDRACAUTO_C2182159.html
footprint CAP-1206 (1206 (3216M) Capacitor)
pins: 1, 2

## C1206C102KGRACAUTO
designator C?  Capacitance: 1nF  (hidden comment: *)
Capacitor, Ceramic (MLCC), 1nF, ±10%, 2kV, X7R, ±10%, SMD 1206; Manufacturer: KEMET; Manufacturer Part Number: C1206C102KGRACAUTO; Package Size: 1206; JLCPCB Basic Part: No; JLCPCB Part Number: C600002; Supplier 1: LCSC; Category: Capacitors - MLCC; Supplier Part Number 1: C600002; Tolerance: ±10%; Voltage Rating: 2kV; Temperature Coefficient: X7R; RoHS: Yes; ComponentLink1Description: Datasheet; ComponentLink1URL: https://wmsc.lcsc.com/wmsc/upload/file/pdf/v2/lcsc/2304140030_KEMET-C1206C102KGRACAUTO_C600002.pdf; ComponentLink2Description: JLCPCB Part URL; ComponentLink2URL: https://jlcpcb.com/partdetail/C600002; ComponentLink3Description: LCSC Part URL; ComponentLink3URL: https://lcsc.com/product-detail/Multilayer-Ceramic-Capacitors-MLCC---SMD-SMT_KEMET-KEMET-C1206C102KGRACAUTO_C600002.html
footprint CAP-1206 (1206 (3216M) Capacitor)
pins: 1, 2

## C1206C103J5GACAUTO
designator C?  Capacitance: 10nF  (hidden comment: *)
Capacitor, Ceramic (MLCC), 10nF, ±5%, 50V, C0G, ±5%, SMD 1206; Manufacturer: KEMET; Manufacturer Part Number: C1206C103J5GACAUTO; Package Size: 1206; JLCPCB Basic Part: No; JLCPCB Part Number: C129668; Supplier 1: LCSC; Category: Capacitors - MLCC; Supplier Part Number 1: C129668; Tolerance: ±5%; Voltage Rating: 50V; Temperature Coefficient: C0G; RoHS: Yes; ComponentLink1Description: Datasheet; ComponentLink1URL: https://wmsc.lcsc.com/wmsc/upload/file/pdf/v2/lcsc/1809031511_KEMET-C1206C103J5GACAUTO_C129668.pdf; ComponentLink2Description: JLCPCB Part URL; ComponentLink2URL: https://jlcpcb.com/partdetail/C129668; ComponentLink3Description: LCSC Part URL; ComponentLink3URL: https://lcsc.com/product-detail/Multilayer-Ceramic-Capacitors-MLCC---SMD-SMT_KEMET-KEMET-C1206C103J5GACAUTO_C129668.html
footprint CAP-1206 (1206 (3216M) Capacitor)
pins: 1, 2

## C1206C103JARACAUTO
designator C?  Capacitance: 10nF  (hidden comment: *)
Capacitor, Ceramic (MLCC), 10nF, ±5%, 250V, X7R, ±5%, SMD 1206; Manufacturer: KEMET; Manufacturer Part Number: C1206C103JARACAUTO; Package Size: 1206; JLCPCB Basic Part: No; JLCPCB Part Number: C129669; Supplier 1: LCSC; Category: Capacitors - MLCC; Supplier Part Number 1: C129669; Tolerance: ±5%; Voltage Rating: 250V; Temperature Coefficient: X7R; RoHS: Yes; ComponentLink1Description: Datasheet; ComponentLink1URL: https://wmsc.lcsc.com/wmsc/upload/file/pdf/v2/lcsc/2304140030_KEMET-C1206C103JARACAUTO_C129669.pdf; ComponentLink2Description: JLCPCB Part URL; ComponentLink2URL: https://jlcpcb.com/partdetail/C129669; ComponentLink3Description: LCSC Part URL; ComponentLink3URL: https://lcsc.com/product-detail/Multilayer-Ceramic-Capacitors-MLCC---SMD-SMT_KEMET-KEMET-C1206C103JARACAUTO_C129669.html
footprint CAP-1206 (1206 (3216M) Capacitor)
pins: 1, 2

## C1206C103K5RAC7800
designator C?  Capacitance: 10nF  (hidden comment: *)
Capacitor, Ceramic (MLCC), 10nF, ±10%, 50V, X7R, ±10%, SMD 1206; Manufacturer: KEMET; Manufacturer Part Number: C1206C103K5RAC7800; Package Size: 1206; JLCPCB Basic Part: No; JLCPCB Part Number: C141181; Supplier 1: LCSC; Category: Capacitors - MLCC; Supplier Part Number 1: C141181; Tolerance: ±10%; Voltage Rating: 50V; Temperature Coefficient: X7R; RoHS: Yes; ComponentLink1Description: Datasheet; ComponentLink1URL: https://wmsc.lcsc.com/wmsc/upload/file/pdf/v2/lcsc/2304140030_KEMET-C1206C103K5RAC7800_C141181.pdf; ComponentLink2Description: JLCPCB Part URL; ComponentLink2URL: https://jlcpcb.com/partdetail/C141181; ComponentLink3Description: LCSC Part URL; ComponentLink3URL: https://lcsc.com/product-detail/Multilayer-Ceramic-Capacitors-MLCC---SMD-SMT_KEMET-KEMET-C1206C103K5RAC7800_C141181.html
footprint CAP-1206 (1206 (3216M) Capacitor)
pins: 1, 2

## C1206C104K1RAC7800
designator C?  Capacitance: 100nF  (hidden comment: *)
Capacitor, Ceramic (MLCC), 100nF, ±10%, 100V, X7R, ±10%, SMD 1206; Manufacturer: KEMET; Manufacturer Part Number: C1206C104K1RAC7800; Package Size: 1206; JLCPCB Basic Part: No; JLCPCB Part Number: C141183; Supplier 1: LCSC; Category: Capacitors - MLCC; Supplier Part Number 1: C141183; Tolerance: ±10%; Voltage Rating: 100V; Temperature Coefficient: X7R; RoHS: Yes; ComponentLink1Description: Datasheet; ComponentLink1URL: https://wmsc.lcsc.com/wmsc/upload/file/pdf/v2/lcsc/2304140030_KEMET-C1206C104K1RAC7800_C141183.pdf; ComponentLink2Description: JLCPCB Part URL; ComponentLink2URL: https://jlcpcb.com/partdetail/C141183; ComponentLink3Description: LCSC Part URL; ComponentLink3URL: https://lcsc.com/product-detail/Multilayer-Ceramic-Capacitors-MLCC---SMD-SMT_KEMET-KEMET-C1206C104K1RAC7800_C141183.html
footprint CAP-1206 (1206 (3216M) Capacitor)
pins: 1, 2

## C1206C104K2RACTU
designator C?  Capacitance: 100nF  (hidden comment: *)
Capacitor, Ceramic (MLCC), 100nF, ±10%, 200V, X7R, ±10%, SMD 1206; Manufacturer: KEMET; Manufacturer Part Number: C1206C104K2RACTU; Package Size: 1206; JLCPCB Basic Part: No; JLCPCB Part Number: C2167701; Supplier 1: LCSC; Category: Capacitors - MLCC; Supplier Part Number 1: C2167701; Tolerance: ±10%; Voltage Rating: 200V; Temperature Coefficient: X7R; RoHS: Yes; ComponentLink1Description: Datasheet; ComponentLink1URL: https://wmsc.lcsc.com/wmsc/upload/file/pdf/v2/lcsc/2307131613_KEMET-C1206C104K2RACTU_C2167701.pdf; ComponentLink2Description: JLCPCB Part URL; ComponentLink2URL: https://jlcpcb.com/partdetail/C2167701; ComponentLink3Description: LCSC Part URL; ComponentLink3URL: https://lcsc.com/product-detail/Multilayer-Ceramic-Capacitors-MLCC---SMD-SMT_KEMET-KEMET-C1206C104K2RACTU_C2167701.html
footprint CAP-1206 (1206 (3216M) Capacitor)
pins: 1, 2
